# Altium footprint library PowerSupply.PcbLib: 67 footprints (part 4 of 5)
Each footprint in its own frame and in the unit in brackets; x right, y up, seen from the top. Pads: shape width x height; smd on the part's side, far side on the other; paste and mask are expansions set on the pad; w line width, h text height; cw(c..) or ccw(c..) is an arc to the next point about the centre after c.
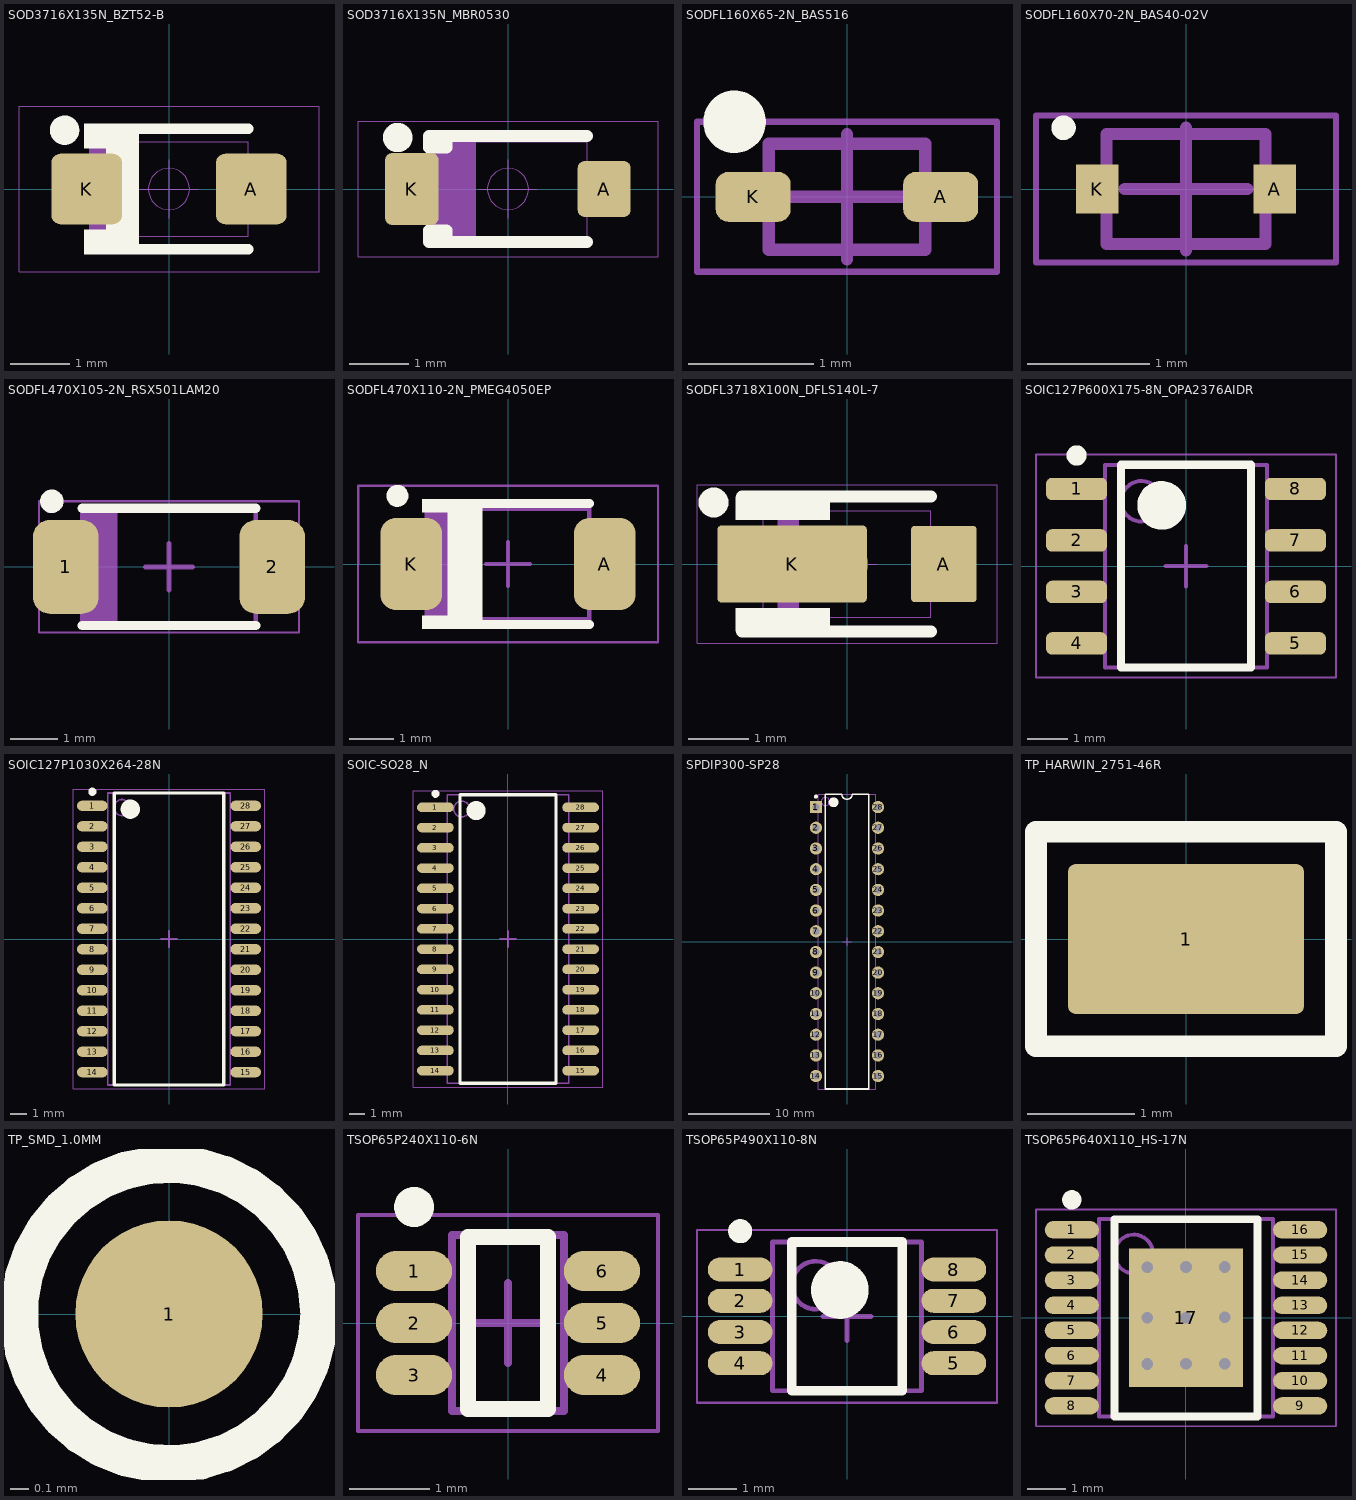
[diagram p3: the footprints below, top view; thin cyan lines are the x and y axes]

## SOD3716X135N_BZT52-B [mm] "SOD123 2.69mm W X 1.60mm L X 1.35mm H body"
height 1.35
pads (2):
  rrect25% 1.2x1.2 smd mask+0.064: A(1.4,0) K(-1.4,0)
Top Overlay:
  circle w0.25: c-1.775,1 r0.125
  rectangle: -1.448,0.686 -0.813,1.118
  rectangle: -1.448,-1.118 -0.813,-0.686
  rectangle: -1.067,-1.067 -0.508,1.067
  lines w0.178: -1.345,-1.027 1.345,-1.027 ; -1.345,1.027 1.345,1.027
Top Assembly Drawing:
  region: -1.345,0.8 -0.552,0.8 -0.552,-0.8 -1.345,-0.8
  lines w0.01: -1.345,-0.8 -1.345,0.8 1.345,0.8 1.345,-0.8 -1.345,-0.8
Top Assembly RefDes:
  text ".Designator" at -0.9,-0.2 h1
Top Courtyard:
  circle w0.01: c0,0 r0.35
  lines w0.01: -0.5,0 0.5,0 ; 0,-0.5 0,0.5 ; -2.55,-1.404 2.55,-1.404 2.55,1.404 -2.55,1.404 -2.55,-1.404
3D body "SODFL350X120-2N.step": height 1.2, standoff 0, extent -1.75,-0.85 1.75,0.85

## SOD3716X135N_MBR0530 [mm] "SOD123 2.65x1.55x1.35mm Body"
height 1.35
pads (2):
  rrect25% 0.9x0.95 smd mask+0.064: A(1.635,0)
  rrect25% 0.91x1.22 smd mask+0.064: K(-1.635,0)
Top Overlay:
  circle w0.25: c-1.875,0.875 r0.125
  lines w0.2: -1.045,-0.9 -1.045,-0.7 -1.345,-0.7 -1.345,-0.9 1.345,-0.9 ; -1.045,0.9 -1.045,0.7 -1.345,0.7 -1.345,0.9 1.345,0.9
Top Assembly Drawing:
  region: -1.345,0.8 -0.552,0.8 -0.552,-0.8 -1.345,-0.8
  lines w0.01: -1.345,-0.8 1.345,-0.8 1.345,0.8 -1.345,0.8 -1.345,-0.8
Top Assembly RefDes:
  text ".Designator" at -0.9,-0.2 h1
Top Courtyard:
  circle w0.01: c0,0 r0.35
  lines w0.01: -0.5,0 0.5,0 ; 0,-0.5 0,0.5 ; -2.55,-1.15 -2.55,1.15 2.55,1.15 2.55,-1.15 -2.55,-1.15
3D body "sod123 v4.step": height 1.2, standoff 0, extent -1.875,-0.85 1.875,0.85

## SODFL160X65-2N_BAS516 [mm] "SODFL, 2-Leads, Body 0.80x1.60mm, IPC Medium Density"
height 0.65
pads (2):
  rrect50% 0.6x0.4 smd paste-0.05: A(0.75,0)
  rrect50% 0.6x0.4 smd paste-0.05 mask+0.102: K(-0.75,0)
Top Overlay:
  circle w0.25: c-0.9,0.6 r0.125
Top Assembly Drawing:
  lines w0.1: -0.625,-0.425 0.625,-0.425 0.625,0.425 -0.625,0.425 -0.625,-0.425
Top Assembly RefDes:
  text "'.Designator'" at -0.5,-0.25 h0.5
Top Courtyard:
  lines w0.05: -1.2,-0.6 1.2,-0.6 1.2,0.6 -1.2,0.6 -1.2,-0.6
  lines w0.1: -0.5,0 0.5,0 ; 0,-0.5 0,0.5
3D body "SODFL160X65-2N.step": height 0.65, standoff 0, extent -0.8,-0.425 0.8,0.425

## SODFL160X70-2N_BAS40-02V [mm] "SODFL, 2-Leads, Body 0.80x1.60mm, IPC Medium Density"
height 0.7
pads (2):
  rect 0.35x0.4 smd: A(0.725,0) K(-0.725,0)
Top Overlay:
  circle w0.1: c-1,0.5 r0.05
Top Assembly Drawing:
  lines w0.1: -0.65,-0.45 0.65,-0.45 0.65,0.45 -0.65,0.45 -0.65,-0.45
Top Assembly RefDes:
  text ".DESIGNATOR" at -0.325,-0.125 h0.25
Top Courtyard:
  lines w0.05: -1.225,-0.6 1.225,-0.6 1.225,0.6 -1.225,0.6 -1.225,-0.6
  lines w0.1: -0.5,0 0.5,0 ; 0,-0.5 0,0.5
3D body "SODFL160X70-2N.step": height 0.7, standoff 0, extent -0.8,-0.45 0.8,0.45

## SODFL470X105-2N_RSX501LAM20 [mm] "SODFL, 2-Leads, Body 2.40x4.70mm, IPC Medium Density"
height 1.05
pads (2):
  rrect50% 1.4x2 smd: 1(-2.2,0) 2(2.2,0)
Top Overlay:
  circle w0.25: c-2.5,1.4 r0.125
  lines w0.2: -1.85,-1.25 1.85,-1.25 ; -1.85,1.25 1.85,1.25
Top Assembly Drawing:
  rectangle: -1.85,-1.25 -1.1,1.25
  lines w0.1: -1.85,-1.25 1.85,-1.25 1.85,1.25 -1.85,1.25 -1.85,-1.25
Top Assembly RefDes:
  text ".Designator" at -0.65,-0.25 h0.5
Top Courtyard:
  lines w0.05: -2.775,-1.4 2.775,-1.4 2.775,1.4 -2.775,1.4 -2.775,-1.4
  lines w0.1: -0.5,0 0.5,0 ; 0,-0.5 0,0.5
3D body "SODFL470X105-2N.step": height 1.05, standoff 0, extent -2.35,-1.25 2.35,1.25

## SODFL470X110-2N_PMEG4050EP [mm] "SODFL, 2-Leads, Body 2.40x4.70mm, IPC Medium Density"
height 1.1
pads (2):
  rrect50% 1.4x2.1 smd: A(2.2,0) K(-2.2,0)
Top Overlay:
  circle w0.25: c-2.515,1.549 r0.125
  rectangle: -1.372,-1.473 -0.584,1.377
  rectangle: -1.956,-1.473 -1.372,-1.168
  rectangle: -1.956,1.168 -1.372,1.473
  lines w0.2: -1.85,-1.377 1.85,-1.377 ; -1.85,1.377 1.85,1.377
Top Assembly Drawing:
  rectangle: -1.85,-1.25 -1.1,1.25
  lines w0.1: -1.85,-1.25 1.85,-1.25 1.85,1.25 -1.85,1.25 -1.85,-1.25
Top Assembly RefDes:
  text ".Designator" at -0.65,-0.25 h0.5
Top Courtyard:
  lines w0.05: 3.41,1.781 3.41,-1.781 -3.411,-1.781 -3.404,1.778 3.41,1.781
  lines w0.1: -0.5,0 0.5,0 ; 0,-0.5 0,0.5
3D body "SODFL470X105-2N.step": height 1.05, standoff 0, extent -2.35,-1.25 2.35,1.25

## SODFL3718X100N_DFLS140L-7 [mm] "POWERDI123-A 2.80mm W X 1.78mm L X 1.00mm H body"
height 1
pads (2):
  rrect10% 1.09x1.27 smd mask+0.064: A(1.615,0)
  rrect10% 2.49x1.28 smd mask+0.064: K(-0.915,0)
Top Overlay:
  circle w0.25: c-2.225,1.025 r0.125
  rectangle: -1.854,0.737 -0.279,1.127
  rectangle: -1.854,-1.127 -0.279,-0.737
  lines w0.203: -1.75,-1.127 1.4,-1.127 ; -1.75,1.127 1.4,1.127
Top Assembly Drawing:
  region: -0.8,0.894 -1.15,0.894 -1.15,-0.894 -0.8,-0.894
  lines w0.013: -1.4,-0.89 -1.4,0.89 1.4,0.89 1.4,-0.89 -1.4,-0.89
Top Assembly RefDes:
  text ".Designator" at -1.626,-0.203 h0.5
Top Courtyard:
  circle w0: c0,0 r0.35
  lines w0: -0.5,0 0.5,0 ; 0,-0.5 0,0.5 ; -2.5,-1.325 2.5,-1.325 2.5,1.325 -2.5,1.325 -2.5,-1.325
3D body "SODFL370X100-2N.step": height 1, standoff 0, extent -1.85,-0.965 1.85,0.965

## SOIC127P600X175-8N_OPA2376AIDR [mm] "SOIC, 8-Leads, Body 4.90x3.90mm, Pitch 1.27mm, IPC Medium Density"
height 1.75
pads (8):
  rrect50% 1.5x0.55 smd: 1(-2.7,1.905) 2(-2.7,0.635) 3(-2.7,-0.635) 4(-2.7,-1.905) 5(2.7,-1.905) 6(2.7,-0.635) 7(2.7,0.635) 8(2.7,1.905)
Top Overlay:
  circle w0.25: c-2.7,2.73 r0.125
  circle w0.6: c-0.6,1.5 r0.3
  lines w0.2: -1.6,-2.5 -1.6,2.5 1.6,2.5 1.6,-2.5 -1.6,-2.5
3D Models:
  circle w0.1: c-1.1,1.6 r0.5
  lines w0.1: -2,-2.5 -2,2.5 2,2.5 2,-2.5 -2,-2.5
Top Courtyard:
  lines w0.05: -3.7,-2.75 -3.7,2.75 3.7,2.75 3.7,-2.75 -3.7,-2.75
  lines w0.1: -0.5,0 0.5,0 ; 0,-0.5 0,0.5
3D body "SOIC127P600X175-8N.step": height 1.75, standoff 0, extent -3,-2.5 3,2.5

## SOIC127P1030X264-28N [mm] "SOIC, 28-Leads, Body 17.88x7.46mm, Pitch 1.27mm, IPC Medium Density"
height 2.64
pads (28):
  oval 1.9x0.65 smd: 1(-4.75,8.255) 2(-4.75,6.985) 3(-4.75,5.715) 4(-4.75,4.445) 5(-4.75,3.175) 6(-4.75,1.905) 7(-4.75,0.635) 8(-4.75,-0.635) 9(-4.75,-1.905) 10(-4.75,-3.175) 11(-4.75,-4.445) 12(-4.75,-5.715) 13(-4.75,-6.985) 14(-4.75,-8.255) 15(4.75,-8.255) 16(4.75,-6.985) 17(4.75,-5.715) 18(4.75,-4.445) 19(4.75,-3.175) 20(4.75,-1.905) 21(4.75,-0.635) 22(4.75,0.635) 23(4.75,1.905) 24(4.75,3.175) 25(4.75,4.445) 26(4.75,5.715) 27(4.75,6.985) 28(4.75,8.255)
Top Overlay:
  circle w0.6: c-2.4,8.05 r0.3
  circle w0.25: c-4.75,9.13 r0.125
  lines w0.2: -3.4,-9.05 3.4,-9.05 3.4,9.05 -3.4,9.05 -3.4,-9.05
3D Models:
  circle w0.1: c-2.9,8.15 r0.5
  lines w0.1: -3.8,-9.05 3.8,-9.05 3.8,9.05 -3.8,9.05 -3.8,-9.05
Top Courtyard:
  lines w0.05: -5.95,-9.3 5.95,-9.3 5.95,9.3 -5.95,9.3 -5.95,-9.3
  lines w0.1: -0.5,0 0.5,0 ; 0,-0.5 0,0.5
3D body "SOIC127P1030X264-28N.step": height 2.64, standoff 0, extent -5.17,-9.05 5.17,9.05

## SOIC-SO28_N [mm] "SOIC, 28-Leads, Body 17.9x7.5mm, Pitch 1.27mm, IPC Medium Density"
height 2.65
pads (28):
  oval 2.3x0.6 smd: 1(-4.55,8.255) 2(-4.55,6.985) 3(-4.55,5.715) 4(-4.55,4.445) 5(-4.55,3.175) 6(-4.55,1.905) 7(-4.55,0.635) 8(-4.55,-0.635) 9(-4.55,-1.905) 10(-4.55,-3.175) 11(-4.55,-4.445) 12(-4.55,-5.715) 13(-4.55,-6.985) 14(-4.55,-8.255) 15(4.55,-8.255) 16(4.55,-6.985) 17(4.55,-5.715) 18(4.55,-4.445) 19(4.55,-3.175) 20(4.55,-1.905) 21(4.55,-0.635) 22(4.55,0.635) 23(4.55,1.905) 24(4.55,3.175) 25(4.55,4.445) 26(4.55,5.715) 27(4.55,6.985) 28(4.55,8.255)
Top Overlay:
  circle w0.25: c-4.55,9.105 r0.125
  circle w0.6: c-2,8.05 r0.3
  lines w0.2: -3,-9.05 -3,9.05 3,9.05 3,-9.05 -3,-9.05
3D Models:
  circle w0.1: c-2.9,8.15 r0.5
  lines w0.1: -3.8,-9.05 -3.8,9.05 3.8,9.05 3.8,-9.05 -3.8,-9.05
Top Courtyard:
  lines w0.05: -5.95,-9.3 -5.95,9.3 5.95,9.3 5.95,-9.3 -5.95,-9.3
  lines w0.1: -0.5,0 0.5,0 ; 0,-0.5 0,0.5
3D body "SOIC127P1030X264-28N.step": height 2.64, standoff 0, extent -5.17,-9.05 5.17,9.05

## SPDIP300-SP28 [mm] "DIP, 28-Leads, Row Spacing 7.62mm, Pitch 2.54mm, Body 34.9x6.8mm"
height 5.33
pads (28):
  rect 1.5x1.5 hole 0.9: 1(-3.81,16.51)
  round 1.5 hole 0.9: 2(-3.81,13.97) 3(-3.81,11.43) 4(-3.81,8.89) 5(-3.81,6.35) 6(-3.81,3.81) 7(-3.81,1.27) 8(-3.81,-1.27) 9(-3.81,-3.81) 10(-3.81,-6.35) 11(-3.81,-8.89) 12(-3.81,-11.43) 13(-3.81,-13.97) 14(-3.81,-16.51) 15(3.81,-16.51) 16(3.81,-13.97) 17(3.81,-11.43) 18(3.81,-8.89) 19(3.81,-6.35) 20(3.81,-3.81) 21(3.81,-1.27) 22(3.81,1.27) 23(3.81,3.81) 24(3.81,6.35) 25(3.81,8.89) 26(3.81,11.43) 27(3.81,13.97) 28(3.81,16.51)
Top Overlay:
  circle w0.25: c-3.81,17.81 r0.125
  circle w0.6: c-1.65,17.1 r0.3
  lines w0.2: -2.65,-18.1 -2.65,18.1 -0.635,18.1 ccw(c0,18.1) 0.635,18.1 2.65,18.1 2.65,-18.1 -2.65,-18.1
3D Models:
  circle w0.1: c-2.65,17.2 r0.5
  lines w0.1: -3.55,-18.1 -3.55,18.1 3.55,18.1 3.55,-18.1 -3.55,-18.1
Top Courtyard:
  lines w0.1: -0.5,0 0.5,0 ; 0,-0.5 0,0.5
3D body: height 5.33, standoff 0, extent -3.55,-18.1 3.55,18.1

## TP_HARWIN_2751-46R [mm] "SMD Test Point"
height 1.5
pads (1):
  rrect10% 2.2x1.4 smd paste+0 mask+0.064: 1(0,0)
Top Overlay:
  lines w0.203: -1.4,-1 1.4,-1 1.4,1 -1.4,1 -1.4,-1
Top Assembly Drawing:
  lines w0.013: -1.05,-0.65 -1.05,0.65 1.05,0.65 1.05,-0.65 -1.05,-0.65
Top Assembly RefDes:
  text ".Designator" at -1.05,-0.25 h0.6
Top Courtyard:
  lines w0: -1.4,-1 -1.4,1 1.4,1 1.4,-1 -1.4,-1
3D body "s2751-46r.stp": height 1.5, standoff 0.08, extent -1,-0.6 1,0.6

## TP_SMD_1.0MM [mm]
pads (1):
  round 1 smd paste-1 mask+0.064: 1(0,0)
Top Overlay:
  circle w0.2: c0,0 r0.8
Top Assembly RefDes:
  text ".Designator" at -0.5,-0.1 h0.5
Top Courtyard:
  circle w0.01: c0,0 r0.8

## TSOP65P240X110-6N [mm] "TSOP, 6-Leads, Body 2.15x1.40mm, Pitch 0.65mm, IPC Medium Density"
height 1.1
pads (6):
  oval 0.95x0.5 smd: 1(-1.175,0.65) 2(-1.175,0) 3(-1.175,-0.65) 4(1.175,-0.65) 5(1.175,0) 6(1.175,0.65)
Top Overlay:
  circle w0.25: c-1.175,1.45 r0.125
  lines w0.2: -0.5,-1.075 0.5,-1.075 0.5,1.075 -0.5,1.075 -0.5,-1.075
3D Models:
  lines w0.1: -0.7,-1.1 0.7,-1.1 0.7,1.1 -0.7,1.1 -0.7,-1.1
Top Courtyard:
  lines w0.05: -1.875,-1.35 1.875,-1.35 1.875,1.35 -1.875,1.35 -1.875,-1.35
  lines w0.1: -0.5,0 0.5,0 ; 0,-0.5 0,0.5
3D body "TSOP65P240X110-6N.step": height 1.1, standoff 0.02, extent -1.188,-1.1 1.188,1.1

## TSOP65P490X110-8N [mm] "TSOP, 8-Leads, Body 3.00x3.00mm, Pitch 0.65mm, IPC Medium Density"
height 1.1
pads (8):
  oval 1.35x0.5 smd: 1(-2.225,0.975) 2(-2.225,0.325) 3(-2.225,-0.325) 4(-2.225,-0.975) 5(2.225,-0.975) 6(2.225,-0.325) 7(2.225,0.325) 8(2.225,0.975)
Top Overlay:
  circle w0.6: c-0.15,0.55 r0.3
  circle w0.25: c-2.225,1.775 r0.125
  lines w0.2: -1.15,-1.55 1.15,-1.55 1.15,1.55 -1.15,1.55 -1.15,-1.55
3D Models:
  circle w0.1: c-0.65,0.65 r0.5
  lines w0.1: -1.55,-1.55 1.55,-1.55 1.55,1.55 -1.55,1.55 -1.55,-1.55
Top Courtyard:
  lines w0.05: -3.125,-1.8 3.125,-1.8 3.125,1.8 -3.125,1.8 -3.125,-1.8
  lines w0.1: -0.5,0 0.5,0 ; 0,-0.5 0,0.5
3D body "TSOP65P490X110-8N.step": height 1.1, standoff 0, extent -2.452,-1.55 2.452,1.55

## TSOP65P640X110_HS-17N [mm] "TSOP, 16-Leads, Body 5.00x4.40mm, Pitch 0.65mm, Thermal Pad 3.58x2.94mm, IPC Medium Density"
height 1.1
pads (17):
  oval 1.4x0.45 smd: 1(-2.95,2.275) 2(-2.95,1.625) 3(-2.95,0.975) 4(-2.95,0.325) 5(-2.95,-0.325) 6(-2.95,-0.975) 7(-2.95,-1.625) 8(-2.95,-2.275) 9(2.95,-2.275) 10(2.95,-1.625) 11(2.95,-0.975) 12(2.95,-0.325) 13(2.95,0.325) 14(2.95,0.975) 15(2.95,1.625) 16(2.95,2.275)
  rect 2.94x3.58 smd: 17(0,0)
via 0,0.007 diameter 0.5 hole 0.3
via -1,1.307 diameter 0.5 hole 0.3
via 0,1.314 diameter 0.5 hole 0.3
via 1,1.314 diameter 0.5 hole 0.3
via -1,0.007 diameter 0.5 hole 0.3
via 1,0.014 diameter 0.5 hole 0.3
via -1,-1.193 diameter 0.5 hole 0.3
via 0,-1.186 diameter 0.5 hole 0.3
via 1,-1.186 diameter 0.5 hole 0.3
Top Overlay:
  circle w0.25: c-2.95,3.05 r0.125
  lines w0.2: -1.85,-2.55 1.85,-2.55 1.85,2.55 -1.85,2.55 -1.85,-2.55
3D Models:
  circle w0.1: c-1.35,1.65 r0.5
  lines w0.1: -2.25,-2.55 -2.25,2.55 2.25,2.55 2.25,-2.55 -2.25,-2.55
Top Courtyard:
  lines w0.05: -3.875,-2.8 -3.875,2.8 3.875,2.8 3.875,-2.8 -3.875,-2.8
  lines w0.1: -0.5,0 0.5,0 ; 0,-0.5 0,0.5
3D body "TSOP65P640X110_HS-17N.step": height 1.1, standoff 0, extent -3.2,-2.55 3.2,2.55